# Altium footprint library AD_Lib.PcbLib: 508 footprints (part 1 of 32)
Each footprint in its own frame and in the unit in brackets; x right, y up, seen from the top. Pads: shape width x height; smd on the part's side, far side on the other; paste and mask are expansions set on the pad; w line width, h text height; cw(c..) or ccw(c..) is an arc to the next point about the centre after c.
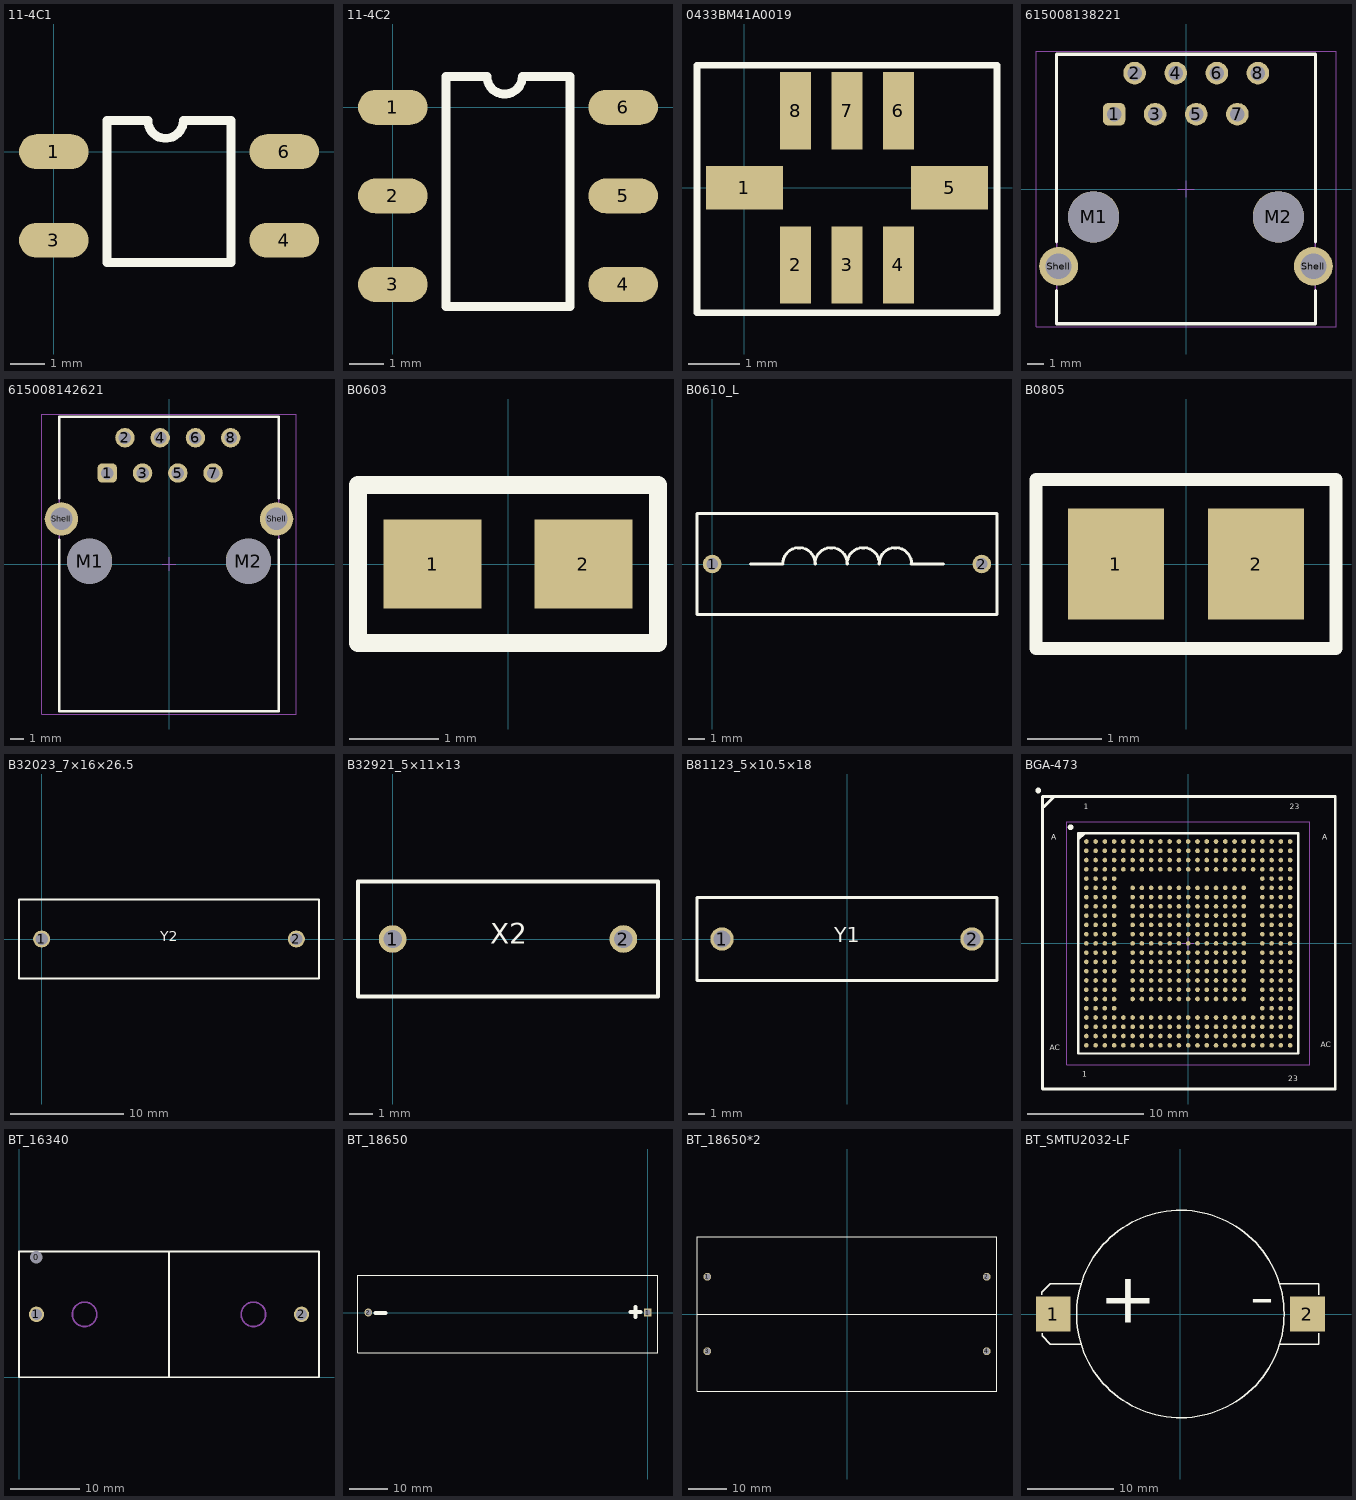
[diagram p0: the footprints below, top view; thin cyan lines are the x and y axes]

## 11-4C1 [mm] "东芝TLP系列光耦，Pitch=100mil。如TLP181、TLP127"
height 2.8
pads (4):
  oval 2x1 smd: 1(0,0) 3(0,-2.54) 4(6.604,-2.54) 6(6.604,0)
Top Overlay:
  lines w0.254: 1.524,-3.175 1.524,0.889 2.696,0.889 ccw(c3.204,0.889) 3.712,0.889 5.08,0.889 5.08,-3.175 1.524,-3.175

## 11-4C2 [mm] "东芝TLP系列光耦，Pitch=100mil。如TLP114"
height 2.8
pads (6):
  oval 2x1 smd: 1(0,0) 2(0,-2.54) 3(0,-5.08) 4(6.604,-5.08) 5(6.604,-2.54) 6(6.604,0)
Top Overlay:
  lines w0.254: 1.524,-5.715 5.08,-5.715 5.08,0.889 3.712,0.889 cw(c3.204,0.889) 2.696,0.889 1.524,0.889 1.524,-5.715

## 0433BM41A0019 [mm] "SO-6，Pitch=50mil。如ACPL-M46T"
height 2.3
pads (8):
  rect 1.5x0.85 smd: 1(0,0) 5(4,0)
  rect 0.6x1.5 smd: 2(1,-1.5) 3(2,-1.5) 4(3,-1.5) 6(3,1.5) 7(2,1.5) 8(1,1.5)
Top Overlay:
  lines w0.127: -0.921,-2.437 -0.921,2.389 4.921,2.389 4.921,-2.437 -0.921,-2.437

## 615008138221 [mm] "Modular Jack Vertical Shielded 8P8C Front Post"
height 16.6
pads (12):
  rrect50% 1.4x1.4 hole 0.9: 1(-4.445,4.625)
  round 1.4 hole 0.9: 2(-3.175,7.165) 3(-1.905,4.625) 4(-0.635,7.165) 5(0.635,4.625) 6(1.905,7.165) 7(3.175,4.625) 8(4.445,7.165)
  round 3.17 hole 3.17 unplated: M1(-5.715,-1.725) M2(5.715,-1.725)
  round 2.4 hole 1.6: Shell(-7.875,-4.775) Shell(7.875,-4.775)
Top Overlay:
  lines w0.2: -8,-6.275 -8,-8.325 8,-8.325 8,-6.275 ; -8,-3.275 -8,8.325 8,8.325 8,-3.275
Courtyard Top:
  lines w0.05: -0.5,0 0.5,0 ; 0,-0.5 0,0.5 ; -9.275,-8.525 -9.275,8.525 9.275,8.525 9.275,-8.525 -9.275,-8.525
3D Body Top:
  lines w0.1: -8,-8.325 8,-8.325 8,8.325 -8,8.325 -8,-8.325
Assembly Top:
  lines w0.1: -8,-8.325 -8,8.325 8,8.325 8,-8.325 -8,-8.325
  text ".Designator" at -7.498,-0.5 h1.5
3D body "615008138221 (rev1).stp": height 16.62, standoff -3.83, extent -8,-8.325 8,8.325

## 615008142621 [mm] "Modular Jack Horizontal Shielded Rear Grounding Post 8P8C Tab Down"
height 13.3
pads (12):
  rrect50% 1.4x1.4 hole 0.9: 1(-4.445,6.55)
  round 1.4 hole 0.9: 2(-3.175,9.09) 3(-1.905,6.55) 4(-0.635,9.09) 5(0.635,6.55) 6(1.905,9.09) 7(3.175,6.55) 8(4.445,9.09)
  round 3.25 hole 3.25 unplated: M1(-5.715,0.2) M2(5.715,0.2)
  round 2.4 hole 1.6: Shell(-7.75,3.25) Shell(7.75,3.25)
Top Overlay:
  lines w0.2: -7.9,1.75 -7.9,-10.6 7.9,-10.6 7.9,1.75 ; -7.9,4.75 -7.9,10.6 7.9,10.6 7.9,4.75
Courtyard Top:
  lines w0.05: -0.5,0 0.5,0 ; 0,-0.5 0,0.5 ; -9.15,-10.8 -9.15,10.8 9.15,10.8 9.15,-10.8 -9.15,-10.8
3D Body Top:
  lines w0.1: -7.9,-10.6 -7.9,10.6 7.9,10.6 7.9,-10.6 -7.9,-10.6
Assembly Top:
  lines w0.1: -7.9,-10.6 7.9,-10.6 7.9,10.6 -7.9,10.6 -7.9,-10.6
  text ".Designator" at -7.498,-0.5 h1.5
3D body "615008142621 (rev1).stp": height 13.7, standoff -3.64, extent -7.94,-10.6 7.94,10.6

## B0603 [mm] "公制1608；英制0603"
height 0.95
pads (2):
  rect 1.1x1 smd: 1(-0.85,0) 2(0.85,0)
Top Overlay:
  lines w0.2: -1.69,-0.889 1.69,-0.889 1.69,0.889 -1.69,0.889 -1.69,-0.889

## B0610_L [mm] "磁珠，卧式"
height 6
pads (2):
  round 1.1 hole 0.7: 1(0,0) 2(16,0)
Top Overlay:
  lines w0.178: -0.9,-3 16.9,-3 ; -0.9,3 16.9,3 ; -0.89,-3 -0.89,3 ; 2.285,0 4.19,0 ; 4.188,0 cw(c5.155,0) 6.122,0 ; 6.093,0 cw(c7.06,0) 8.027,0 ; 7.998,0 cw(c8.965,0) 9.932,0 ; 9.903,0 cw(c10.87,0) 11.837,0 ; 11.81,0 13.715,0 ; 16.89,-3 16.89,3

## B0805 [mm] "公制2012；英制0805"
height 1.05
pads (2):
  rect 1.3x1.5 smd: 1(-0.95,0) 2(0.95,0)
Top Overlay:
  lines w0.178: -2.032,-1.143 -2.032,1.143 2.032,1.143 2.032,-1.143 -2.032,-1.143

## B32023_7×16×26.5 [mm] "TDK之X2电容，引脚间距=22.5mm，尺寸 = w × h × l"
height 16
pads (2):
  round 1.5 hole 1.1: 1(0,0) 2(22.5,0)
Top Overlay:
  lines w0.178: -2,-3.5 -2,3.5 24.5,3.5 24.5,-3.5 -2,-3.5
  text "Y2" at 10.488,-0.508 h1.52

## B32921_5×11×13 [mm] "TDK之X2电容，引脚间距 = 10mm，尺寸 = w × h × l"
height 11
pads (2):
  round 1.2 hole 0.8: 1(0,0) 2(10,0)
Top Overlay:
  lines w0.178: -1.5,2.492 11.5,2.492 11.5,-2.5 -1.5,-2.5 -1.5,2.5
  text "X2" at 4.238,-0.508 h1.52

## B81123_5×10.5×18 [mm] "TDK之Y1电容，引脚间距 = 15mm，尺寸 = w × h × l"
height 10.5
pads (2):
  round 1.4 hole 1: 1(-7.5,0) 2(7.5,0)
Top Overlay:
  lines w0.178: -9,-2.5 9,-2.5 9,2.5 -9,2.5 -9,-2.5
  text "Y1" at -0.762,-0.508 h1.52

## BGA-473 [mm] "BGA, 81-Leads, Body 19.0x19.0mm,  Pitch 0.80mm"
height 1.6
pads (473):
  round 0.4 smd: A1(-8.8,8.8) A2(-8,8.8) A3(-7.2,8.8) A4(-6.4,8.8) A5(-5.6,8.8) A6(-4.8,8.8) A7(-4,8.8) A8(-3.2,8.8) A9(-2.4,8.8) A10(-1.6,8.8) A11(-0.8,8.8) A12(0,8.8) A13(0.8,8.8) A14(1.6,8.8) A15(2.4,8.8) A16(3.2,8.8) A17(4,8.8) A18(4.8,8.8) A19(5.6,8.8) A20(6.4,8.8) A21(7.2,8.8) A22(8,8.8) A23(8.8,8.8) AA1(-8.8,-7.2) AA2(-8,-7.2) AA3(-7.2,-7.2) AA4(-6.4,-7.2) AA5(-5.6,-7.2) AA6(-4.8,-7.2) AA7(-4,-7.2) AA8(-3.2,-7.2) AA9(-2.4,-7.2) AA10(-1.6,-7.2) AA11(-0.8,-7.2) AA12(0,-7.2) AA13(0.8,-7.2) AA14(1.6,-7.2) AA15(2.4,-7.2) AA16(3.2,-7.2) AA17(4,-7.2) AA18(4.8,-7.2) AA19(5.6,-7.2) AA20(6.4,-7.2) AA21(7.2,-7.2) AA22(8,-7.2) AA23(8.8,-7.2) AB1(-8.8,-8) AB2(-8,-8) AB3(-7.2,-8) AB4(-6.4,-8) AB5(-5.6,-8) AB6(-4.8,-8) AB7(-4,-8) AB8(-3.2,-8) AB9(-2.4,-8) AB10(-1.6,-8) AB11(-0.8,-8) AB12(0,-8) AB13(0.8,-8) AB14(1.6,-8) AB15(2.4,-8) AB16(3.2,-8) AB17(4,-8) AB18(4.8,-8) AB19(5.6,-8) AB20(6.4,-8) AB21(7.2,-8) AB22(8,-8) AB23(8.8,-8) AC1(-8.8,-8.8) AC2(-8,-8.8) AC3(-7.2,-8.8) AC4(-6.4,-8.8) AC5(-5.6,-8.8) AC6(-4.8,-8.8) AC7(-4,-8.8) AC8(-3.2,-8.8) AC9(-2.4,-8.8) AC10(-1.6,-8.8) AC11(-0.8,-8.8) AC12(0,-8.8) AC13(0.8,-8.8) AC14(1.6,-8.8) AC15(2.4,-8.8) AC16(3.2,-8.8) AC17(4,-8.8) AC18(4.8,-8.8) AC19(5.6,-8.8) AC20(6.4,-8.8) AC21(7.2,-8.8) AC22(8,-8.8) AC23(8.8,-8.8) B1(-8.8,8) B2(-8,8) B3(-7.2,8) B4(-6.4,8) B5(-5.6,8) B6(-4.8,8) B7(-4,8) B8(-3.2,8) B9(-2.4,8) B10(-1.6,8) B11(-0.8,8) B12(0,8) B13(0.8,8) B14(1.6,8) B15(2.4,8) B16(3.2,8) B17(4,8) B18(4.8,8) B19(5.6,8) B20(6.4,8) B21(7.2,8) B22(8,8) B23(8.8,8) C1(-8.8,7.2) C2(-8,7.2) C3(-7.2,7.2) C4(-6.4,7.2) C5(-5.6,7.2) C6(-4.8,7.2) C7(-4,7.2) C8(-3.2,7.2) C9(-2.4,7.2) C10(-1.6,7.2) C11(-0.8,7.2) C12(0,7.2) C13(0.8,7.2) C14(1.6,7.2) C15(2.4,7.2) C16(3.2,7.2) C17(4,7.2) C18(4.8,7.2) C19(5.6,7.2) C20(6.4,7.2) C21(7.2,7.2) C22(8,7.2) C23(8.8,7.2) D1(-8.8,6.4) D2(-8,6.4) D3(-7.2,6.4) D4(-6.4,6.4) D5(-5.6,6.4) D6(-4.8,6.4) D7(-4,6.4) D8(-3.2,6.4) D9(-2.4,6.4) D10(-1.6,6.4) D11(-0.8,6.4) D12(0,6.4) D13(0.8,6.4) D14(1.6,6.4) D15(2.4,6.4) D16(3.2,6.4) D17(4,6.4) D18(4.8,6.4) D19(5.6,6.4) D20(6.4,6.4) D21(7.2,6.4) D22(8,6.4) D23(8.8,6.4) E1(-8.8,5.6) E2(-8,5.6) E3(-7.2,5.6) E4(-6.4,5.6) E20(6.4,5.6) E21(7.2,5.6) E22(8,5.6) E23(8.8,5.6) F1(-8.8,4.8) F2(-8,4.8) F3(-7.2,4.8) F4(-6.4,4.8) F6(-4.8,4.8) F7(-4,4.8) F8(-3.2,4.8) F9(-2.4,4.8) F10(-1.6,4.8) F11(-0.8,4.8) F12(0,4.8) F13(0.8,4.8) F14(1.6,4.8) F15(2.4,4.8) F16(3.2,4.8) F17(4,4.8) F18(4.8,4.8) F20(6.4,4.8) F21(7.2,4.8) F22(8,4.8) F23(8.8,4.8) G1(-8.8,4) G2(-8,4) G3(-7.2,4) G4(-6.4,4) G6(-4.8,4) G7(-4,4) G8(-3.2,4) G9(-2.4,4) G10(-1.6,4) G11(-0.8,4) G12(0,4) G13(0.8,4) G14(1.6,4) G15(2.4,4) G16(3.2,4) G17(4,4) G18(4.8,4) G20(6.4,4) G21(7.2,4) G22(8,4) G23(8.8,4) H1(-8.8,3.2) H2(-8,3.2) H3(-7.2,3.2) H4(-6.4,3.2) H6(-4.8,3.2) H7(-4,3.2) H8(-3.2,3.2) H9(-2.4,3.2) H10(-1.6,3.2) H11(-0.8,3.2) H12(0,3.2) H13(0.8,3.2) H14(1.6,3.2) H15(2.4,3.2) H16(3.2,3.2) H17(4,3.2) H18(4.8,3.2) H20(6.4,3.2) H21(7.2,3.2) H22(8,3.2) H23(8.8,3.2) J1(-8.8,2.4) J2(-8,2.4) J3(-7.2,2.4) J4(-6.4,2.4) J6(-4.8,2.4) J7(-4,2.4) J8(-3.2,2.4) J9(-2.4,2.4) J10(-1.6,2.4) J11(-0.8,2.4) J12(0,2.4) J13(0.8,2.4) J14(1.6,2.4) J15(2.4,2.4) J16(3.2,2.4) J17(4,2.4) J18(4.8,2.4) J20(6.4,2.4) J21(7.2,2.4) J22(8,2.4) J23(8.8,2.4) K1(-8.8,1.6) K2(-8,1.6) K3(-7.2,1.6) K4(-6.4,1.6) K6(-4.8,1.6) K7(-4,1.6) K8(-3.2,1.6) K9(-2.4,1.6) K10(-1.6,1.6) K11(-0.8,1.6) K12(0,1.6) K13(0.8,1.6) K14(1.6,1.6) K15(2.4,1.6) K16(3.2,1.6) K17(4,1.6) K18(4.8,1.6) K20(6.4,1.6) K21(7.2,1.6) K22(8,1.6) K23(8.8,1.6) L1(-8.8,0.8) L2(-8,0.8) L3(-7.2,0.8) L4(-6.4,0.8) L6(-4.8,0.8) L7(-4,0.8) L8(-3.2,0.8) L9(-2.4,0.8) L10(-1.6,0.8) L11(-0.8,0.8) L12(0,0.8) L13(0.8,0.8) L14(1.6,0.8) L15(2.4,0.8) L16(3.2,0.8) L17(4,0.8) L18(4.8,0.8) L20(6.4,0.8) L21(7.2,0.8) L22(8,0.8) L23(8.8,0.8) M1(-8.8,0) M2(-8,0) M3(-7.2,0) M4(-6.4,0) M6(-4.8,0) M7(-4,0) M8(-3.2,0) M9(-2.4,0) M10(-1.6,0) M11(-0.8,0) M12(0,0) M13(0.8,0) M14(1.6,0) M15(2.4,0) M16(3.2,0) M17(4,0) M18(4.8,0) M20(6.4,0) M21(7.2,0) M22(8,0) M23(8.8,0) N1(-8.8,-0.8) N2(-8,-0.8) N3(-7.2,-0.8) N4(-6.4,-0.8) N6(-4.8,-0.8) N7(-4,-0.8) N8(-3.2,-0.8) N9(-2.4,-0.8) N10(-1.6,-0.8) N11(-0.8,-0.8) N12(0,-0.8) N13(0.8,-0.8) N14(1.6,-0.8) N15(2.4,-0.8) N16(3.2,-0.8) N17(4,-0.8) N18(4.8,-0.8) N20(6.4,-0.8) N21(7.2,-0.8) N22(8,-0.8) N23(8.8,-0.8) P1(-8.8,-1.6) P2(-8,-1.6) P3(-7.2,-1.6) P4(-6.4,-1.6) P6(-4.8,-1.6) P7(-4,-1.6) P8(-3.2,-1.6) P9(-2.4,-1.6) P10(-1.6,-1.6) P11(-0.8,-1.6) P12(0,-1.6) P13(0.8,-1.6) P14(1.6,-1.6) P15(2.4,-1.6) P16(3.2,-1.6) P17(4,-1.6) P18(4.8,-1.6) P20(6.4,-1.6) P21(7.2,-1.6) P22(8,-1.6) P23(8.8,-1.6) R1(-8.8,-2.4) R2(-8,-2.4) R3(-7.2,-2.4) R4(-6.4,-2.4) R6(-4.8,-2.4) R7(-4,-2.4) R8(-3.2,-2.4) R9(-2.4,-2.4) R10(-1.6,-2.4) R11(-0.8,-2.4) R12(0,-2.4) R13(0.8,-2.4) R14(1.6,-2.4) R15(2.4,-2.4) R16(3.2,-2.4) R17(4,-2.4) R18(4.8,-2.4) R20(6.4,-2.4) R21(7.2,-2.4) R22(8,-2.4) R23(8.8,-2.4) T1(-8.8,-3.2) T2(-8,-3.2) T3(-7.2,-3.2) T4(-6.4,-3.2) T6(-4.8,-3.2) T7(-4,-3.2) T8(-3.2,-3.2) T9(-2.4,-3.2) T10(-1.6,-3.2) T11(-0.8,-3.2) T12(0,-3.2) T13(0.8,-3.2) T14(1.6,-3.2) T15(2.4,-3.2) T16(3.2,-3.2) T17(4,-3.2) T18(4.8,-3.2) T20(6.4,-3.2) T21(7.2,-3.2) T22(8,-3.2) T23(8.8,-3.2) U1(-8.8,-4) U2(-8,-4) U3(-7.2,-4) U4(-6.4,-4) U6(-4.8,-4) U7(-4,-4) U8(-3.2,-4) U9(-2.4,-4) U10(-1.6,-4) U11(-0.8,-4) U12(0,-4) U13(0.8,-4) U14(1.6,-4) U15(2.4,-4) U16(3.2,-4) U17(4,-4) U18(4.8,-4) U20(6.4,-4) U21(7.2,-4) U22(8,-4) U23(8.8,-4) V1(-8.8,-4.8) V2(-8,-4.8) V3(-7.2,-4.8) V4(-6.4,-4.8) V6(-4.8,-4.8) V7(-4,-4.8) V8(-3.2,-4.8) V9(-2.4,-4.8) V10(-1.6,-4.8) V11(-0.8,-4.8) V12(0,-4.8) V13(0.8,-4.8) V14(1.6,-4.8) V15(2.4,-4.8) V16(3.2,-4.8) V17(4,-4.8) V18(4.8,-4.8) V20(6.4,-4.8) V21(7.2,-4.8) V22(8,-4.8) V23(8.8,-4.8) W1(-8.8,-5.6) W2(-8,-5.6) W3(-7.2,-5.6) W4(-6.4,-5.6) W20(6.4,-5.6) W21(7.2,-5.6) W22(8,-5.6) W23(8.8,-5.6) Y1(-8.8,-6.4) Y2(-8,-6.4) Y3(-7.2,-6.4) Y4(-6.4,-6.4) Y5(-5.6,-6.4) Y6(-4.8,-6.4) Y7(-4,-6.4) Y8(-3.2,-6.4) Y9(-2.4,-6.4) Y10(-1.6,-6.4) Y11(-0.8,-6.4) Y12(0,-6.4) Y13(0.8,-6.4) Y14(1.6,-6.4) Y15(2.4,-6.4) Y16(3.2,-6.4) Y17(4,-6.4) Y18(4.8,-6.4) Y19(5.6,-6.4) Y20(6.4,-6.4) Y21(7.2,-6.4) Y22(8,-6.4) Y23(8.8,-6.4)
Top Overlay:
  circle w0.25: c-10.158,10.033 r0.125
  circle w0.254: c-12.954,13.208 r0.127
  region: -8.949,9.5 -9.5,8.949 -9.5,9.5
  lines w0.2: -9.5,8.949 -8.949,9.5 ; -9.5,-9.5 9.5,-9.5 9.5,9.5 -9.5,9.5 -9.5,-9.5
  lines w0.254: -12.446,11.811 -11.684,12.573 ; -12.573,-12.573 12.7,-12.573 12.7,12.7 -12.573,12.7 -12.573,-12.573
  text "1" at -9.144,-11.684 h0.82
  text "23" at 8.636,-12.065 h0.82
  text "A" at 11.557,8.763 h0.82
  text "AC" at 11.43,-9.144 h0.82
  text "A" at -11.811,8.763 h0.82
  text "AC" at -11.938,-9.398 h0.82
  text "1" at -9.017,11.43 h0.82
  text "23" at 8.763,11.43 h0.82
Mechanical 13:
  lines w0.1: -9.5,-9.5 9.5,-9.5 9.5,9.5 -9.5,9.5 -9.5,-9.5
Mechanical 15:
  lines w0.1: -0.5,0 0.5,0 ; 0,-0.5 0,0.5 ; -10.5,-10.5 10.5,-10.5 10.5,10.5 -10.5,10.5 -10.5,-10.5
3D body: height 1.6, standoff 0.1, extent -9.5,-9.5 9.5,9.5

## BT_16340 [mm] "16340电池座，1节"
height 21.54
pads (3):
  round 1.5 hole 1.8: 0(2.5,17.2)
  round 2.2 hole 1.6: 1(2.5,9) 2(40.5,9)
Top Overlay:
  lines w0.254: 21.5,0 21.5,18 ; 0,0 0,18 43,18 43,0 0,0
Mechanical 1:
  circle w0.254: c33.6,9 r1.75
  circle w0.254: c9.4,9 r1.75

## BT_18650 [mil] "18650电池座，1节"
height 848.03
pads (2):
  rect 80x80 hole 62: 1(0,0)
  round 80 hole 62: 2(-2850,0)
Top Overlay:
  lines w10: -2955,-410 105,-410 105,380 -2955,380 -2955,-410
  lines w39.37: -2775,-5 -2675,-5 ; -175,5 -75,5 ; -125,-45 -125,55

## BT_18650*2 [mil] "18650电池座，2节"
height 848.03
pads (4):
  round 80 hole 62: 1(-1425,380) 2(1425,380) 3(-1425,-380) 4(1425,-380)
Top Overlay:
  lines w10: -1530,0 1530,0 ; -1530,-790 1530,-790 1530,790 -1530,790 -1530,-790

## BT_SMTU2032-LF [mm] "锂电池基座，对应锂电池CR2032MFR"
height 5.6
pads (2):
  rect 4x4 smd: 1(-14.7,0) 2(14.7,0)
Top Overlay:
  circle w0.152: c0,0 r12
  lines w0.152: -16.053,2.21 -16.053,2.489 -15.042,3.5 -11.506,3.5 ; -16,-2.24 -16,-2.542 -15.042,-3.5 -11.532,-3.5 ; 11.481,3.5 16,3.5 16,2.235 ; 11.496,-3.5 16,-3.5 ; 16,-3.48 16,-2.215
  text "+" at -9.398,-2.921 h10
  text "-" at 8.001,-2.413 h10